# Altium footprint library TimeCard-NIC-V1.PcbLib: 104 footprints (part 7 of 7)
Each footprint in its own frame and in the unit in brackets; x right, y up, seen from the top. Pads: shape width x height; smd on the part's side, far side on the other; paste and mask are expansions set on the pad; w line width, h text height; cw(c..) or ccw(c..) is an arc to the next point about the centre after c.
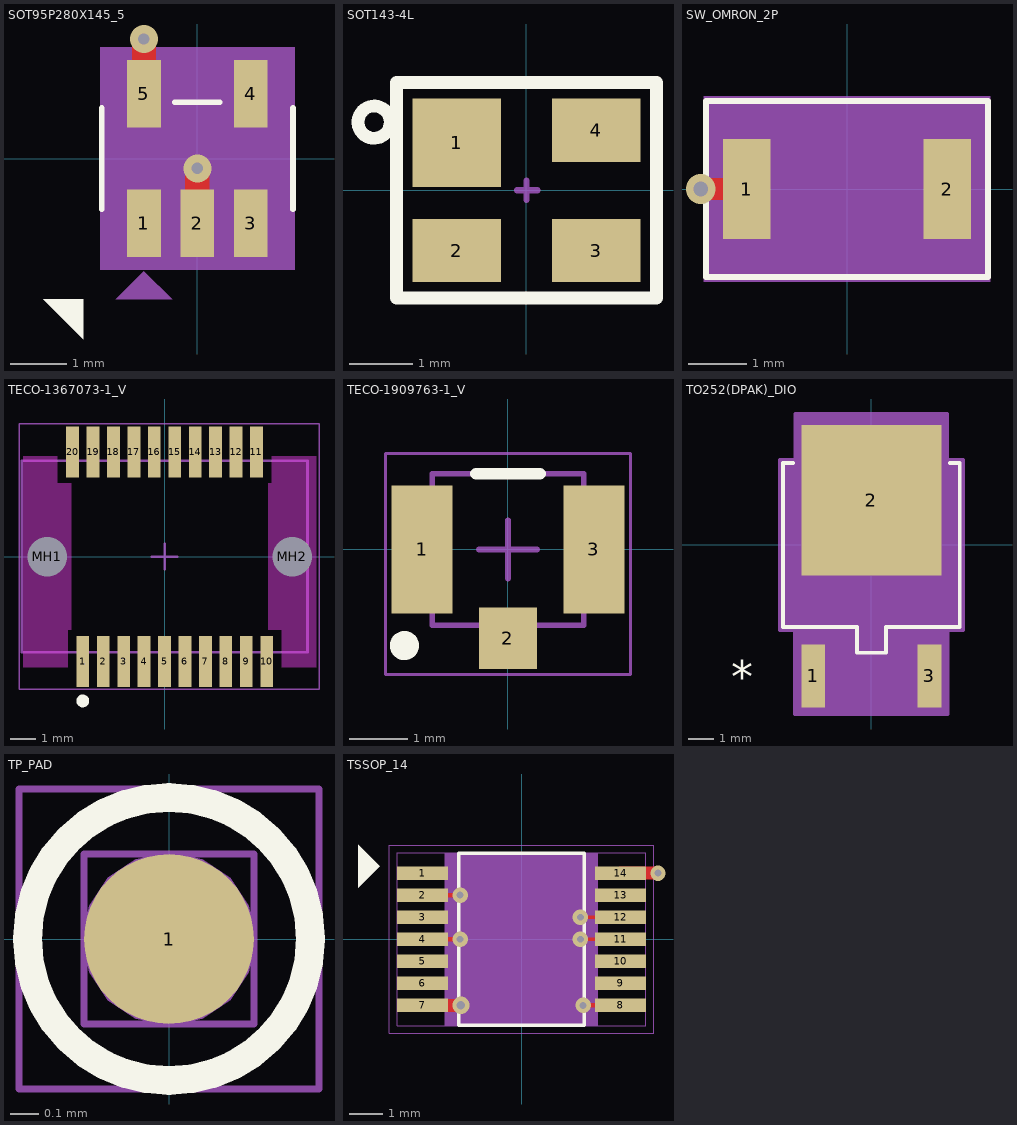
[diagram p6: the footprints below, top view; thin cyan lines are the x and y axes]

## SOT95P280X145_5 [mm] "SOT95P280X145_5"
height 10.85
pads (5):
  rect 0.6x1.2 smd: 1(-0.95,-1.15) 2(0,-1.15) 3(0.95,-1.15) 4(0.95,1.15) 5(-0.95,1.15)
via -0.95,2.127 diameter 0.5 hole 0.203
via 0,-0.173 diameter 0.5 hole 0.203
Top Layer:
  lines w0.432: -0.95,1.15 -0.95,2.127 ; 0,-1.15 0,-0.173
Top Overlay:
  dashed: -2.032,-2.501 -2.739,-2.501 -2.032,-3.209
  lines w0.102: -1.7,-0.9 -1.7,0.9 ; -0.4,1 0.4,1 ; 1.7,-0.9 1.7,0.9
Top 3D Body:
  region: -1.5,0.875 1.5,0.875 1.5,-0.875 -1.5,-0.875
Top Courtyard:
  dashed: -1.5,-1.75 1.5,-1.75 1.5,1.75 -1.5,1.75
Top Assembly:
  dashed: -0.95,-2 -1.45,-2.5 -0.45,-2.5
  dashed: -0.678,-0.4 -0.702,-0.523 -0.772,-0.628 -0.877,-0.698 -1,-0.722 -1.123,-0.698 -1.158,-0.674 -1.228,-0.628 -1.298,-0.523 -1.322,-0.4 -1.298,-0.277 -1.228,-0.172 -1.158,-0.126 -1.123,-0.102 -1,-0.078 -0.877,-0.102 -0.772,-0.172 -0.702,-0.277
  lines w0.025: -1.5,-0.875 -1.5,0.875 1.5,0.875 1.5,-0.875 -1.5,-0.875
  text ".Designator" at -0.806,2.996 h0.64
Top Component Center:
  circle w0.025: c0,0 r0.524
Bottom Component Center:
  text "1" at -1.864,-1.722 h2.29
  text "3" at 0.036,-1.722 h2.29
  text "4" at 0.036,0.579 h2.29
  text "2" at -0.914,-1.722 h2.29
  text "5" at -1.864,0.579 h2.29
Top Component Outline:
  text "SYM NAME:SOT95P280X145_5" at -12.596,15.483 h0.64
  text "MFR:STMICRO STMPS2151STR" at -12.596,18.023 h0.64
  text "DIM IN MM" at -12.346,10.613 h0.64
  text "COMP HT:1.45MM" at -12.596,12.943 h0.64
  text "CHECKED BY: CAROL 6-11-2020" at -12.281,5.67 h0.64
  text "CREATED BY:GI 06/08/20" at -12.231,8.07 h0.64
Mechanical 30:
  dashed: -1.73,-1.98 -1.73,1.98 1.73,1.98 1.73,-1.98
3D body: height 3.81, standoff 0, extent -1.5,-0.875 1.5,0.875

## SOT143-4L [mm] "SOT143-4L, 4-Leads, Body 2.95x2.4mm, Pitch 1.70/1.90mm"
height 1.075
pads (4):
  rect 1.4x1.4 smd: 1(-1.1,0.75)
  rect 1.4x1 smd: 2(-1.1,-0.95) 3(1.1,-0.95) 4(1.1,0.95)
Top Overlay:
  circle w0.2: c-2.404,1.075 r0.254
  lines w0.2: -2.05,-1.7 2.05,-1.7 2.05,1.7 -2.05,1.7 -2.05,-1.675
Mechanical 15:
  lines w0.1: -2.05,-1.7 -2.05,1.7 ; -0.15,0 0.175,0 ; 0,-0.15 0,0.15 ; 2.075,-1.688 2.075,1.741
  lines w0.102: -2.05,-1.7 2.05,-1.7 ; -1.989,1.741 2.075,1.741
3D body "WE-TVS_High_Speed_SOT143-4L.stp": height 1.03, standoff -0.03, extent -1.2,-1.46 1.2,1.46

## SW_OMRON_2P [mm] "SW_OMRON_2P"
height 10.85
pads (2):
  rect 0.81x1.7 smd: 1(-1.706,0) 2(1.706,0)
via -2.492,0 diameter 0.508 hole 0.249
Top Layer:
  lines w0.381: -2.492,0 -1.706,0
Top Overlay:
  lines w0.102: -2.4,-1.5 -2.4,1.5 2.4,1.5 2.4,-1.5 -2.4,-1.5
  text ".Designator" at 2.908,-1.482 h0.76
Top 3D Body:
  region: -1.5,1.25 -1.5,-1.25 1.5,-1.25 1.5,1.25
Top Courtyard:
  dashed: -2.113,-1.25 2.113,-1.25 2.113,1.25 -2.113,1.25
Top Assembly:
  lines w0.025: -1.5,-1.25 -1.5,1.25 1.5,1.25 1.5,-1.25 -1.5,-1.25
Bottom Component Center:
  text "2" at 1.49,-0.381 h0.64
  text "1" at -1.922,-0.381 h0.64
Mechanical 26:
  dashed: -2.443,-1.58 2.443,-1.58 2.443,1.58 -2.443,1.58
Top Component Outline:
  text "CHECKED: CH 6-26-2020" at -19.11,6.378 h0.64
  text "CONVERTED BY: GI 06-24-20" at -19.251,9 h0.64
  text "CHECKED BY: CAROL 4-14-16" at -19.273,11.247 h0.64
  text "CREATED BY: GREG I. 03/24/16" at -19.223,13.647 h0.64
  text "DIM IN MM" at -19.338,16.19 h0.64
  text "COMP HT: 1.75MM" at -19.338,18.52 h0.64
  text "SYM NAME: SW_OMRON_2P" at -19.338,21.06 h0.64
  text "MFR: OMRON P/N B3U-1000P (NO BOSS)" at -19.338,23.6 h0.64
3D body: height 3.81, standoff 0, extent -1.5,-1.25 1.5,1.25

## TECO-1367073-1_V [mm] "Connector, 20-Leads, Body 11.2x7.5mm, Pitch 0.8mm"
height 5.4
pads (22):
  rect 0.5x2 smd: 1(-3.2,-4.1) 2(-2.4,-4.1) 3(-1.6,-4.1) 4(-0.8,-4.1) 5(0,-4.1) 6(0.8,-4.1) 7(1.6,-4.1) 8(2.4,-4.1) 9(3.2,-4.1) 10(4,-4.1) 11(3.6,4.1) 12(2.8,4.1) 13(2,4.1) 14(1.2,4.1) 15(0.4,4.1) 16(-0.4,4.1) 17(-1.2,4.1) 18(-2,4.1) 19(-2.8,4.1) 20(-3.6,4.1)
  round 1.25 hole 1.55 unplated: MH1(-4.6,0) MH2(5,0)
Top Layer keep-out:
  rectangle: -5.55,-4.34 -3.79,-2.032
  region: 5.95,-2.286 4.59,-2.286 4.59,-4.34 5.95,-4.34
  region: 5.95,3.94 4.19,3.94 4.19,2.286 5.95,2.286
  region: 5.95,2.88 4.05,2.88 4.05,-2.88 5.95,-2.88
  rectangle: -5.55,-2.88 -3.65,2.88
  rectangle: -5.55,2.032 -4.19,3.94
Top Overlay:
  circle w0.25: c-3.2,-5.65 r0.125
Mechanical 13:
  lines w0.1: -5.6,-3.75 -5.6,3.75 5.6,3.75 5.6,-3.75 -5.6,-3.75
Mechanical 15:
  lines w0.05: -5.7,-5.2 6.05,-5.2 6.05,5.2 -5.7,5.2 -5.7,-5.2
  lines w0.1: -0.5,0 0.5,0 ; 0,-0.5 0,0.5
3D body "c-1367073-1-f-3d.stp": height 5.2, standoff -0.8, extent -5.308,-4.495 5.692,4.505

## TECO-1909763-1_V [mm] "SMD, 3-Leads, Body 2.6x2.6mm, Height 1.25mm"
height 1.25
pads (3):
  rect 1.05x2.2 smd: 1(-1.475,0) 3(1.475,0)
  rect 1x1.05 smd: 2(0,-1.525)
Top Overlay:
  circle w0.25: c-1.778,-1.65 r0.125
  lines w0.2: -0.55,1.3 0.55,1.3
Mechanical 13:
  lines w0.1: -1.3,-1.3 -1.3,1.3 1.3,1.3 1.3,-1.3 -1.3,-1.3
Mechanical 15:
  lines w0.05: -2.1,-2.15 -2.1,1.65 2.1,1.65 2.1,-2.15 -2.1,-2.15
  lines w0.1: -0.5,0 0.5,0 ; 0,-0.5 0,0.5
3D body "c-1909763-1-b-3d.stp": height 1.23, standoff 0, extent -1.5,-1.55 1.5,1.55

## TO252(DPAK)_DIO [mil]
height 104.33
pads (3):
  rect 37x98 smd paste+0 mask+0: 1(-90,-203) 3(90,-203)
  rect 217x233 smd paste+0 mask+0: 2(0,69.5)
Top Overlay:
  lines w6: -121.6,127 -137,127 -137,-127 -22.5,-127 -22.5,-167 22.5,-167 22.5,-127 137,-127 137,127 121.6,127
  text "*" at -217.5,-228 h50
Mechanical 13:
  lines w1: -132,-122 -132,122 132,122 132,-122 -132,-122 ; -107.5,-238 -72.5,-238 -72.5,-122 -107.5,-122 -107.5,-238 ; -17.5,-162 17.5,-162 17.5,-122 -17.5,-122 -17.5,-162 ; 72.5,-238 107.5,-238 107.5,-122 72.5,-122 72.5,-238
  text "*" at -102.5,-137 h50
Mechanical 15:
  region: -142,-132 -142,132 -117.5,132 -117.5,203 117.5,203 117.5,132 142,132 142,-132 118.5,-132 118.5,-262 -118.5,-262 -118.5,-132
  lines w6: -142,-132 -118.5,-132 -118.5,-262 118.5,-262 118.5,-132 142,-132 142,132 117.5,132 117.5,203 -117.5,203 -117.5,132 -142,132 -142,-132
3D body "TO252DPAK_DIO.step": height 94.09, standoff -2.01, extent -132.01,-237.99 132.01,172.01

## TP_PAD [mm] "TP_PAD"
height 10.85
pads (1):
  round 0.6 smd: 1(0,0)
Top Overlay:
  lines w0.102: -0.5,0 ccw(c0,0) 0,-0.5 ccw(c0,0) 0.5,0 ccw(c0,0) 0,0.5 ccw(c0,0) -0.5,0
Top 3D Body:
  region: 0.306,0 0.283,0.117 0.216,0.216 0.117,0.283 0,0.306 -0.117,0.283 -0.15,0.26 -0.216,0.216 -0.283,0.117 -0.306,0 -0.283,-0.117 -0.216,-0.216 -0.15,-0.26 -0.117,-0.283 0,-0.306 0.117,-0.283 0.216,-0.216 0.283,-0.117
Top Courtyard:
  lines w0.025: -0.3,-0.3 0.3,-0.3 0.3,0.3 -0.3,0.3 -0.3,-0.3
Top Assembly:
  text ".Designator" at -1.016,1.482 h0.64
Bottom Component Center:
  text "1" at -0.254,0 h0.64
Mechanical 26:
  lines w0.025: -0.53,-0.53 0.53,-0.53 0.53,0.53 -0.53,0.53 -0.53,-0.53
Top Component Outline:
  text "CONVERTED TO METRIC NAD UPDATED FOR 2018 LIBRARY" at -10.795,6.35 h0.64
  text "SMT_TEST POINT, NO STEP FILE REQUIRED." at -10.795,8.255 h0.64
  text "C. HENLEY 1-9-19." at -10.4,4.2 h0.64
3D body: height 3.81, standoff 0, extent -0.306,-0.306 0.306,0.306

## TSSOP_14 [mm] "TSSOP_14"
height 10.85
pads (14):
  rect 1.5x0.4 smd: 1(-2.92,1.95) 2(-2.92,1.3) 3(-2.92,0.65) 4(-2.92,0) 5(-2.92,-0.65) 6(-2.92,-1.3) 7(-2.92,-1.95) 8(2.92,-1.95) 9(2.92,-1.3) 10(2.92,-0.65) 11(2.92,0) 12(2.92,0.65) 13(2.92,1.3) 14(2.92,1.95)
via -1.789,-1.95 diameter 0.508 hole 0.249
via 1.814,-1.95 diameter 0.457 hole 0.203
via -1.814,0 diameter 0.457 hole 0.203
via 1.738,0 diameter 0.457 hole 0.203
via 1.738,0.65 diameter 0.457 hole 0.203
via -1.814,1.3 diameter 0.457 hole 0.203
via 4.026,1.95 diameter 0.457 hole 0.203
Top Layer:
  lines w0.094: 1.738,0 2.92,0 ; 1.738,0.65 2.92,0.65
  lines w0.132: -2.92,0 -1.814,0 ; -2.92,1.3 -1.814,1.3 ; 1.814,-1.95 2.92,-1.95
  lines w0.381: -2.92,-1.95 -1.789,-1.95 ; 2.92,1.95 4.026,1.95
Top Overlay:
  dashed: -4.826,2.794 -4.826,1.524 -4.191,2.159
  lines w0.102: -1.854,-2.54 1.854,-2.54 1.854,2.54 -1.854,2.54 -1.854,-2.54
Top 3D Body:
  region: -2.25,-2.55 2.25,-2.55 2.25,2.55 -2.25,2.55
Top Courtyard:
  lines w0.025: -3.67,-2.55 -3.67,2.55 3.67,2.55 3.67,-2.55 -3.67,-2.55
Top Assembly:
  lines w0.025: -2.25,-2.55 -2.25,2.55 2.25,2.55 2.25,-2.55 -2.25,-2.55
  text ".Designator" at 0,-1.524 h1.27
Top Component Center:
  circle w0.025: c0,0 r0.18
Bottom Component Center:
  text "8" at 2.92,-2.204 h0.64
  text "1" at -2.92,1.696 h0.64
  text "4" at -2.92,-0.254 h0.64
  text "2" at -2.92,1.046 h0.64
  text "10" at 2.92,-1.158 h0.64
  text "12" at 2.92,0.142 h0.64
  text "9" at 2.92,-1.554 h0.64
  text "11" at 2.92,-0.508 h0.64
  text "7" at -2.92,-2.204 h0.64
  text "14" at 2.92,1.442 h0.64
  text "13" at 2.92,0.792 h0.64
  text "6" at -2.92,-1.554 h0.64
  text "5" at -2.92,-0.904 h0.64
  text "3" at -2.92,0.396 h0.64
Top Component Outline:
  text "MFR: NXP SEMI PCA9543A" at -11.938,31.115 h0.64
  text "SYM NAME: TSSOP_14" at -11.938,27.94 h0.64
  text "COMP. HT: 43mil" at -11.938,24.765 h0.64
  text "PADSTACKS: R60_16" at -11.938,21.59 h0.64
  text "DIM IN INCH [MM]" at -11.938,18.415 h0.64
  text "CREATED BY MVU 11-30-10" at -11.938,15.748 h0.64
  text "RE-CHECK BY C. HENLEY 12-2-10" at -11.938,13.335 h0.64
  text "CONVERTED TO METRIC AND UPDATES FOR 2018 LIBRARY" at -9.525,9.271 h0.64
Mechanical 30:
  lines w0.025: -3.9,-2.78 -3.9,2.78 3.9,2.78 3.9,-2.78 -3.9,-2.78
3D body: height 3.81, standoff 0, extent -2.25,-2.55 2.25,2.55